# Altium footprint library LibPCB.PcbLib: 76 footprints (part 3 of 5)
Each footprint in its own frame and in the unit in brackets; x right, y up, seen from the top. Pads: shape width x height; smd on the part's side, far side on the other; paste and mask are expansions set on the pad; w line width, h text height; cw(c..) or ccw(c..) is an arc to the next point about the centre after c.
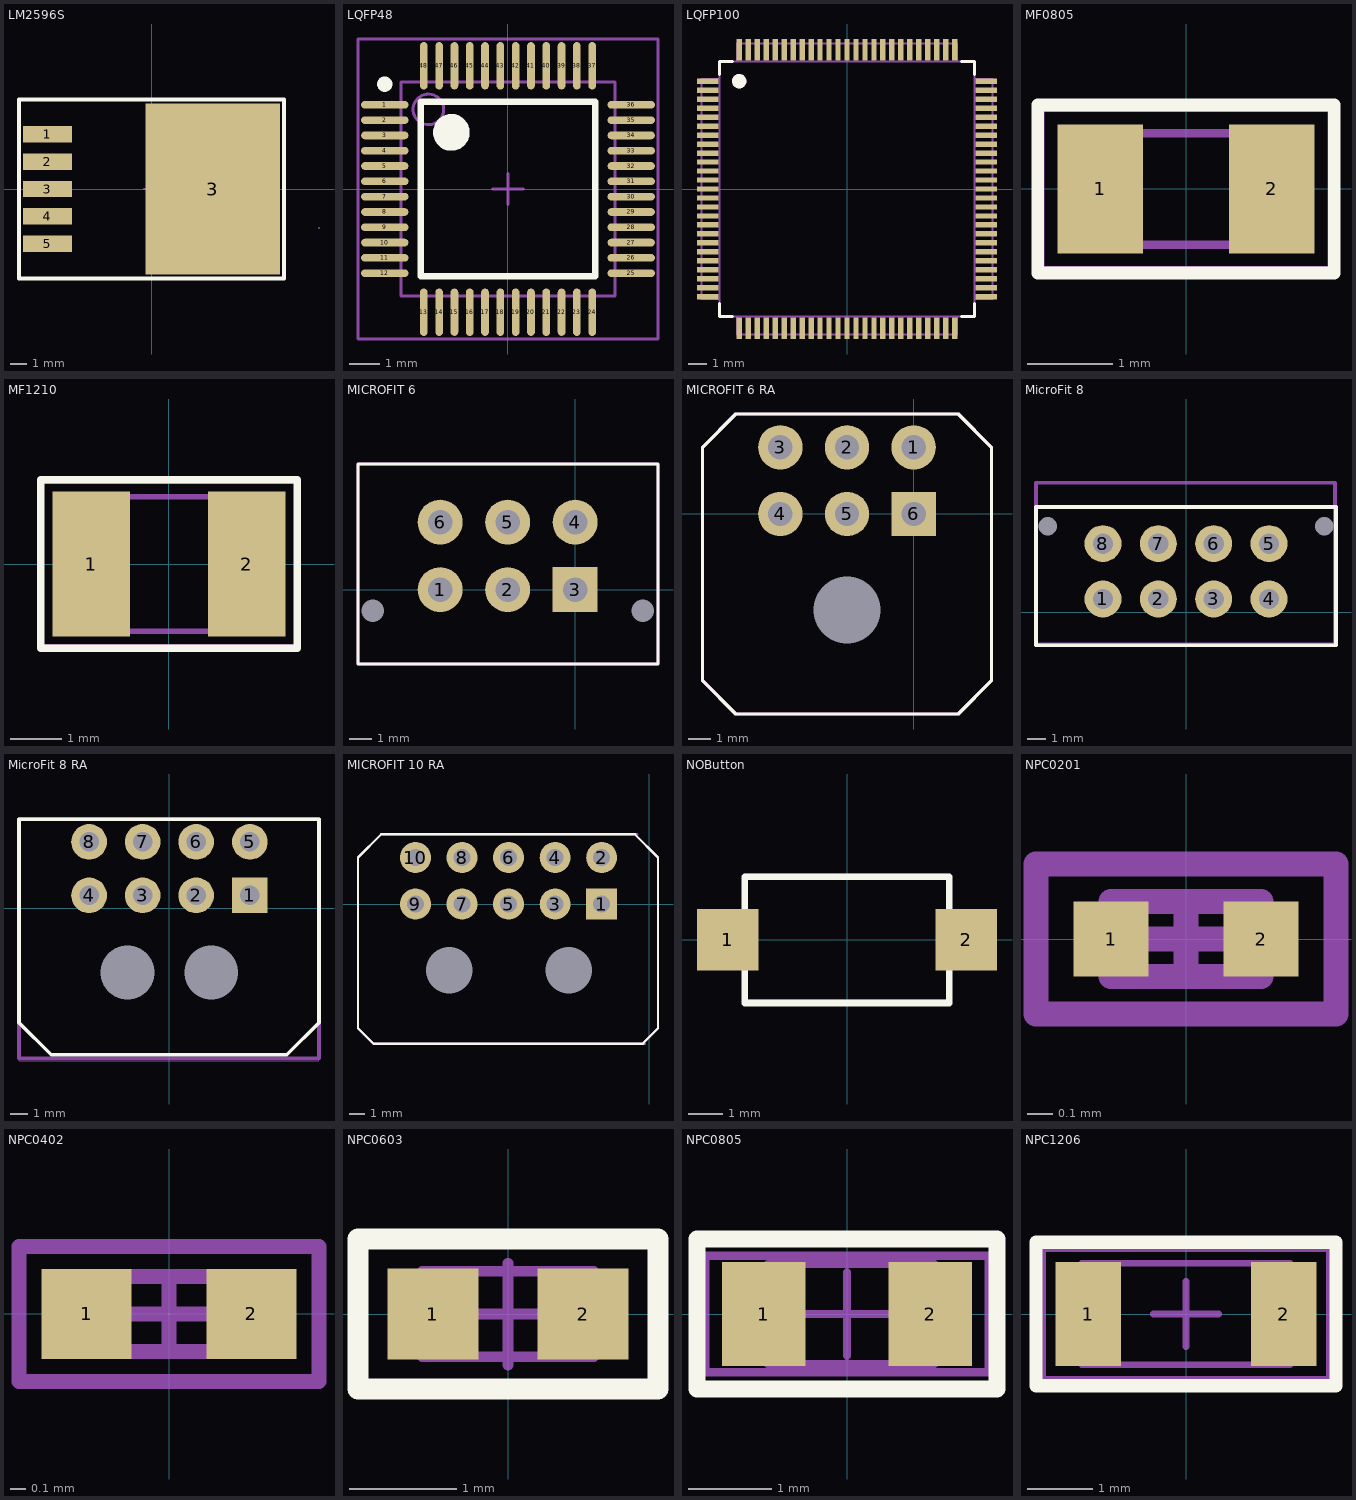
[diagram p2: the footprints below, top view; thin cyan lines are the x and y axes]

## LM2596S [mm]
pads (6):
  rect 3.05x1.016 smd: 1(-6.485,3.404) 2(-6.485,1.702) 3(-6.485,0) 4(-6.485,-1.702) 5(-6.485,-3.404)
  rect 8.38x10.66 smd: 3(3.82,0)
Top Overlay:
  lines w0.25: -8.26,-5.58 8.26,-5.58 8.26,5.58 -8.26,5.58 -8.26,-5.58
Mechanical 1:
  lines w0.1: -8.26,-5.58 8.26,-5.58 ; -8.26,5.58 8.26,5.58 ; 8.26,-5.58 8.26,5.58 ; 8.26,-5.58 8.26,5.58 ; 10.426,-2.428 10.426,-2.428
Mechanical 15:
  lines w0.1: -0.5,0 0.5,0 ; 0,-0.5 0,0.5 ; -8.26,-5.58 8.26,-5.58 8.26,5.58 -8.26,5.58 -8.26,-5.58
3D body "TS5B.stp": height 4.8, standoff -0.05, extent -7.048,-5.207 5.083,5.207

## LQFP48 [mm]
height 1.6
pads (48):
  oval 1.55x0.25 smd: 1(-4.025,2.75) 2(-4.025,2.25) 3(-4.025,1.75) 4(-4.025,1.25) 5(-4.025,0.75) 6(-4.025,0.25) 7(-4.025,-0.25) 8(-4.025,-0.75) 9(-4.025,-1.25) 10(-4.025,-1.75) 11(-4.025,-2.25) 12(-4.025,-2.75) 25(4.025,-2.75) 26(4.025,-2.25) 27(4.025,-1.75) 28(4.025,-1.25) 29(4.025,-0.75) 30(4.025,-0.25) 31(4.025,0.25) 32(4.025,0.75) 33(4.025,1.25) 34(4.025,1.75) 35(4.025,2.25) 36(4.025,2.75)
  oval 0.25x1.55 smd: 13(-2.75,-4.025) 14(-2.25,-4.025) 15(-1.75,-4.025) 16(-1.25,-4.025) 17(-0.75,-4.025) 18(-0.25,-4.025) 19(0.25,-4.025) 20(0.75,-4.025) 21(1.25,-4.025) 22(1.75,-4.025) 23(2.25,-4.025) 24(2.75,-4.025) 37(2.75,4.025) 38(2.25,4.025) 39(1.75,4.025) 40(1.25,4.025) 41(0.75,4.025) 42(0.25,4.025) 43(-0.25,4.025) 44(-0.75,4.025) 45(-1.25,4.025) 46(-1.75,4.025) 47(-2.25,4.025) 48(-2.75,4.025)
Top Overlay:
  circle w0.6: c-1.85,1.85 r0.3
  circle w0.25: c-4.025,3.425 r0.125
  lines w0.2: -2.85,-2.85 2.85,-2.85 2.85,2.85 -2.85,2.85 -2.85,-2.85
Mechanical 13:
  circle w0.1: c-2.6,2.6 r0.5
  lines w0.1: -3.5,-3.5 3.5,-3.5 3.5,3.5 -3.5,3.5 -3.5,-3.5
Mechanical 15:
  lines w0.1: -0.5,0 0.5,0 ; 0,-0.5 0,0.5 ; -4.9,-4.9 4.9,-4.9 4.9,4.9 -4.9,4.9 -4.9,-4.9
3D body: height 1.6, standoff 0, extent -3.5,-3.5 3.5,3.5

## LQFP100 [mm] "Microcontroller"
height 1.6
pads (100):
  rect 1.2x0.3 smd: 1(-7.75,6) 2(-7.75,5.5) 3(-7.75,5) 4(-7.75,4.5) 5(-7.75,4) 6(-7.75,3.5) 7(-7.75,3) 8(-7.75,2.5) 9(-7.75,2) 10(-7.75,1.5) 11(-7.75,1) 12(-7.75,0.5) 13(-7.75,0) 14(-7.75,-0.5) 15(-7.75,-1) 16(-7.75,-1.5) 17(-7.75,-2) 18(-7.75,-2.5) 19(-7.75,-3) 20(-7.75,-3.5) 21(-7.75,-4) 22(-7.75,-4.5) 23(-7.75,-5) 24(-7.75,-5.5) 25(-7.75,-6) 51(7.75,-6) 52(7.75,-5.5) 53(7.75,-5) 54(7.75,-4.5) 55(7.75,-4) 56(7.75,-3.5) 57(7.75,-3) 58(7.75,-2.5) 59(7.75,-2) 60(7.75,-1.5) 61(7.75,-1) 62(7.75,-0.5) 63(7.75,0) 64(7.75,0.5) 65(7.75,1) 66(7.75,1.5) 67(7.75,2) 68(7.75,2.5) 69(7.75,3) 70(7.75,3.5) 71(7.75,4) 72(7.75,4.5) 73(7.75,5) 74(7.75,5.5) 75(7.75,6)
  rect 0.3x1.2 smd: 26(-6,-7.75) 27(-5.5,-7.75) 28(-5,-7.75) 29(-4.5,-7.75) 30(-4,-7.75) 31(-3.5,-7.75) 32(-3,-7.75) 33(-2.5,-7.75) 34(-2,-7.75) 35(-1.5,-7.75) 36(-1,-7.75) 37(-0.5,-7.75) 38(0,-7.75) 39(0.5,-7.75) 40(1,-7.75) 41(1.5,-7.75) 42(2,-7.75) 43(2.5,-7.75) 44(3,-7.75) 45(3.5,-7.75) 46(4,-7.75) 47(4.5,-7.75) 48(5,-7.75) 49(5.5,-7.75) 50(6,-7.75) 76(6,7.75) 77(5.5,7.75) 78(5,7.75) 79(4.5,7.75) 80(4,7.75) 81(3.5,7.75) 82(3,7.75) 83(2.5,7.75) 84(2,7.75) 85(1.5,7.75) 86(1,7.75) 87(0.5,7.75) 88(0,7.75) 89(-0.5,7.75) 90(-1,7.75) 91(-1.5,7.75) 92(-2,7.75) 93(-2.5,7.75) 94(-3,7.75) 95(-3.5,7.75) 96(-4,7.75) 97(-4.5,7.75) 98(-5,7.75) 99(-5.5,7.75) 100(-6,7.75)
Top Overlay:
  circle w0.4: c-6,6 r0.2
  lines w0.15: -7.1,-6.375 -7.1,-7.1 -6.375,-7.1 ; -7.1,6.375 -7.1,7.1 -6.375,7.1 ; 6.375,-7.1 7.1,-7.1 7.1,-6.375 ; 6.375,7.1 7.1,7.1 7.1,6.375
Mechanical 9:
  text ".Comment" at -1.08,-0.495 h0.6
  text ".Designator" at -1.2,0.155 h0.8
Mechanical 11:
  circle w0.4: c-6,6 r0.2
  lines w0.1: -7.1,-6.135 -8.1,-6.135 -8.1,6.135 -7.1,6.135 ; -6.135,-7.1 -6.135,-8.1 6.135,-8.1 6.135,-7.1 ; -6.135,7.1 -6.135,8.1 6.135,8.1 6.135,7.1 ; 7.1,-6.135 8.1,-6.135 8.1,6.135 7.1,6.135 ; -7.1,-7.1 7.1,-7.1 7.1,7.1 -7.1,7.1 -7.1,-7.1
3D body "User Library-LQFP100_Grid_0_5.STEP": height 1.6, standoff 0, extent -8.025,-8 7.975,8

## MF0805 [mm]
height 0.5
pads (2):
  rect 1x1.5 smd: 1(-1,0) 2(1,0)
Top Overlay:
  lines w0.15: -1.73,-0.98 1.73,-0.98 1.73,0.98 -1.73,0.98 -1.73,-0.98
Mechanical 9:
  text ".Comment" at -0.9,1.2 h0.6
  text ".Designator" at -1.3,1.9 h0.8
Mechanical 11:
  lines w0.1: -1.7,-0.95 -1.7,0.95 1.7,0.95 1.7,-0.95 -1.7,-0.95
Mechanical 15:
  lines w0.1: -1.05,-0.65 1.05,-0.65 1.05,0.65 -1.05,0.65 -1.05,-0.65
3D body "mf-psmf050x-2.stp": height 0.66, standoff 0, extent -1.075,-0.675 1.075,0.675

## MF1210 [mm]
height 0.55
pads (2):
  rect 1.5x2.8 smd: 1(-1.5,0) 2(1.5,0)
Top Overlay:
  lines w0.15: -2.48,-1.63 -2.48,1.63 2.48,1.63 2.48,-1.63 -2.48,-1.63
Mechanical 9:
  text ".Comment" at -0.9,1.9 h0.6
  text ".Designator" at -1.3,2.6 h0.8
Mechanical 11:
  lines w0.1: -1.55,-1.3 1.55,-1.3 1.55,1.3 -1.55,1.3 -1.55,-1.3
Mechanical 15:
  lines w0.1: -2.5,-1.6 -2.5,1.6 2.5,1.6 2.5,-1.6 -2.5,-1.6
3D body "User Library-0_2A--MF-USMF020.step": height 1.1, standoff 0, extent -1.715,-1.4 1.715,1.4

## MICROFIT 6 [mm]
pads (8):
  round 2 hole 1.1: 1(-6,0) 2(-3,0) 4(0,3) 5(-3,3) 6(-6,3)
  rect 2x2 hole 1.1: 3(0,0)
  round 0 hole 1 unplated: ""(-9,-0.94) ""(3,-0.94)
Top Overlay:
  lines w0.15: -9.652,-3.302 3.683,-3.302 3.683,5.588 -9.652,5.588 -9.652,-3.302
Mechanical 9:
  text ".Comment" at -1.627,-2.764 h0.6
  text ".Designator" at -1.637,-2.194 h0.8
Mechanical 11:
  lines w0.15: -9.652,-3.302 -9.652,5.588 3.683,5.588 3.683,-3.302 -9.652,-3.302
3D body "430450612.stp": height 9.95, standoff -3.14, extent -9.575,-3.3 3.575,5.47

## MICROFIT 6 RA [mm]
pads (7):
  round 2 hole 1.1: 1(0,3) 2(-3,3) 3(-6,3) 4(-6,0) 5(-3,0)
  rect 2x2 hole 1.1: 6(0,0)
  round 1.5 hole 3 unplated: ""(-3,-4.32)
Top Overlay:
  lines w0.15: -9.5,-7.5 -8,-9 2,-9 3.5,-7.5 3.5,3 2,4.5 -8,4.5 -9.5,3 -9.5,-7.5
Mechanical 9:
  text ".Designator" at -2.78,-7.02 h0.8
  text ".Comment" at -2.77,-7.59 h0.6
Mechanical 11:
  lines w0.15: -9.5,-7.5 -8,-9 2,-9 3.5,-7.5 3.5,3 2,4.5 -8,4.5 -9.5,3 -9.5,-7.5
3D body "430450601.stp": height 8.73, standoff -3.21, extent -9.575,-8.95 3.575,3.29

## MicroFit 8 [mm]
pads (10):
  round 2 hole 1.1: 1(-4.5,0.73) 2(-1.5,0.73) 3(1.5,0.73) 4(4.5,0.73) 5(4.5,3.73) 6(1.5,3.73) 7(-1.5,3.73) 8(-4.5,3.73)
  round 0 hole 1 mask+0: ""(-7.5,4.67) ""(7.5,4.67)
Top Overlay:
  lines w0.2: -8.128,-1.778 3.753,-1.778 8.128,-1.778 8.128,5.715 -8.128,5.715 -8.128,-1.778
Mechanical 9:
  text ".Designator" at -1.85,-1.325 h0.8
  text ".Comment" at -1.45,-2.025 h0.6
Mechanical 11:
  lines w0.2: -8.128,-1.74 8.075,-1.74 8.075,7.03 -8.128,7.03 -8.128,-1.74
Mechanical 15:
  lines w0.05: -8.128,-1.74 8.075,-1.74 8.075,7.03 -8.128,7.03 -8.128,-1.74
3D body: height 0.25, standoff 0, extent 5.08,-1.016 5.08,-1.016
3D body "430450827.stp": height 9.95, standoff -3.14, extent -8.075,-1.74 8.075,7.03

## MicroFit 8 RA [mm]
pads (10):
  rect 2x2 hole 1.1: 1(4.5,0.73)
  round 2 hole 1.1: 2(1.5,0.73) 3(-1.5,0.73) 4(-4.5,0.73) 5(4.5,3.73) 6(1.5,3.73) 7(-1.5,3.73) 8(-4.5,3.73)
  round 1 hole 3: ""(-2.35,-3.59) ""(2.35,-3.59)
Top Overlay:
  lines w0.2: -8.425,-6.4 -6.625,-8.2 6.575,-8.2 8.375,-6.4 8.375,-6.175 8.375,5 -8.425,5 -8.425,-6.175 -8.425,-6.4
Mechanical 9:
  text ".Designator" at -1.85,-1.325 h0.8
  text ".Comment" at -1.45,-2.025 h0.6
Mechanical 11:
  lines w0.2: -8.425,-8.4 8.375,-8.4 8.375,5 -8.425,5 -8.425,-8.4
Mechanical 15:
  lines w0.05: -8.4,-8.525 8.35,-8.525 8.35,5.1 -8.4,5.1 -8.4,-8.525
3D body "microfit 8.stp": height 8.8, standoff 0.03, extent -8.075,-8.25 8.075,4.84

## MICROFIT 10 RA [mm]
pads (12):
  rect 2x2 hole 1.1: 1(-3.048,0)
  round 2 hole 1.1: 2(-3.048,3) 3(-6.048,0) 4(-6.048,3) 5(-9.048,0) 6(-9.048,3) 7(-12.048,0) 8(-12.048,3) 9(-15.048,0) 10(-15.048,3)
  round 1.5 hole 3 unplated: ""(-12.875,-4.25) ""(-5.175,-4.25)
Top Overlay:
  lines w0.15: -0.921,4.5 0.579,3 0.579,-8 -0.421,-9 ; -0.889,4.5 -17.25,4.5 -18.75,3 -18.75,-8 -17.75,-9 -0.381,-9
  lines w0.254: -15.048,0 -15,0
Mechanical 9:
  text ".Comment" at -2.745,-7.59 h0.6
  text ".Designator" at -2.755,-7.02 h0.8
Mechanical 11:
  lines w0.15: -0.921,4.5 0.579,3 0.579,-8 -0.421,-9 ; -0.762,4.5 -17.25,4.5 -18.75,3 -18.75,-8 -17.75,-9 -0.254,-9
3D body "430451000.stp": height 8.83, standoff -3.12, extent -18.6,-8.92 0.55,3.32

## NOButton [mm]
height 2.5
pads (2):
  rect 1.8x1.8 smd: 1(-3.5,0) 2(3.5,0)
Top Overlay:
  lines w0.2: -3,-1.85 -3,1.5 -3,1.85 3,1.85 3,-1.5 3,-1.85 -3,-1.85
Mechanical 9:
  text ".Designator" at -1.703,3.273 h0.8
  text ".Comment" at -1.303,2.573 h0.6
Mechanical 11:
  lines w0.1: -3,-1.5 -3,-1.8 3,-1.8 3,-1.5 ; -3,1.5 -3,1.9 3,1.9 3,1.5
3D body "Кнопка_IT-1181.STEP": height 2.5, standoff 0, extent -4,-1.8 4,1.8

## NPC0201 [mm] "Non polar chip capacitor, size 0201"
height 0.23
pads (2):
  rect 0.3x0.3 smd: 1(-0.3,0) 2(0.3,0)
Mechanical 1:
  lines w0.1: -0.3,-0.15 0.3,-0.15 0.3,0.15 -0.3,0.15 -0.3,-0.15
Mechanical 9:
  text ".Comment" at -1.054,-0.524 h0.6
  text ".Designator" at -1.454,0.176 h0.8
Mechanical 11:
  lines w0.1: -0.6,-0.3 -0.6,0.3 0.6,0.3 0.6,-0.3 -0.6,-0.3
Mechanical 15:
  lines w0.1: -0.15,0 0.15,0 ; 0,-0.15 0,0.15
3D body "User Library-0201(0603M) Cap.STEP": height 0.31, standoff 0, extent -0.305,-0.152 0.305,0.152

## NPC0402 [mm] "Non polar chip capacitor, size 0402"
height 0.35
pads (2):
  rect 0.6x0.6 smd: 1(-0.55,0) 2(0.55,0)
Mechanical 1:
  lines w0.1: -0.5,-0.25 0.5,-0.25 0.5,0.25 -0.5,0.25 -0.5,-0.25
Mechanical 9:
  text ".Comment" at -1.054,-0.524 h0.6
  text ".Designator" at -1.454,0.176 h0.8
Mechanical 11:
  lines w0.1: -1,-0.45 -1,0.45 1,0.45 1,-0.45 -1,-0.45
Mechanical 15:
  lines w0.1: -0.25,0 0.25,0 ; 0,-0.25 0,0.25
3D body "User Library-0402(1005M) Cap.step": height 0.51, standoff 0, extent -0.508,-0.254 0.508,0.254

## NPC0603 [mm] "Non polar chip capacitor, size 0603"
height 0.45
pads (2):
  rect 0.85x0.85 smd: 1(-0.7,0) 2(0.7,0)
Top Overlay:
  lines w0.2: -1.4,-0.7 1.4,-0.7 1.4,0.7 -1.4,0.7 -1.4,-0.7
Mechanical 1:
  lines w0.1: -0.8,-0.4 0.8,-0.4 0.8,0.4 -0.8,0.4 -0.8,-0.4
Mechanical 9:
  text ".Designator" at -1.454,0.049 h0.8
  text ".Comment" at -1.054,-0.651 h0.6
Mechanical 11:
  lines w0.1: -1.4,-0.7 1.4,-0.7 1.4,0.7 -1.4,0.7 -1.4,-0.7
Mechanical 15:
  lines w0.1: -0.475,0 0.475,0 ; 0,-0.475 0,0.475
3D body "SW3dPS-0603 SMD Capacitor.STEP": height 0.3, standoff 0, extent -0.8,-0.4 0.8,0.4

## NPC0805 [mm] "Non polar chip capacitor, size 0805"
height 0.45
pads (2):
  rect 1x1.25 smd: 1(-1,0) 2(1,0)
Top Overlay:
  lines w0.2: -1.8,-0.9 1.8,-0.9 1.8,0.9 -1.8,0.9 -1.8,-0.9
Mechanical 1:
  lines w0.1: -0.949,-0.6 1.05,-0.6 1.05,0.6 -0.949,0.6 -0.949,-0.6
Mechanical 9:
  text ".Comment" at -0.508,-0.508 h0.6
  text ".Designator" at -1.397,0.127 h0.8
Mechanical 11:
  lines w0.1: -1.7,-0.7 1.7,-0.7 1.7,0.7 -1.7,0.7 -1.7,-0.7
Mechanical 15:
  lines w0.1: -0.5,0 0.5,0 ; 0,-0.5 0,0.5
3D body "SW3dPS-0805 SMD Capacitor.STEP": height 0.78, standoff 0, extent -1,-0.625 1,0.625

## NPC1206 [mm] "Non polar chip capacitor, size 1206"
height 0.6
pads (2):
  rect 1x1.6 smd: 1(-1.5,0) 2(1.5,0)
Top Overlay:
  lines w0.2: -2.3,-1.1 -2.3,1.1 2.3,1.1 2.3,-1.1 -2.3,-1.1
Mechanical 1:
  lines w0.1: -1.6,-0.775 -1.6,0.775 1.6,0.775 1.6,-0.775 -1.6,-0.775
Mechanical 9:
  text ".Designator" at -1.454,0.176 h0.8
  text ".Comment" at -1.054,-0.524 h0.6
Mechanical 11:
  lines w0.1: -2.2,-1 2.2,-1 2.2,1 -2.2,1 -2.2,-1
Mechanical 15:
  lines w0.1: -0.5,0 0.5,0 ; 0,-0.5 0,0.5
3D body "SW3dPS-1206 SMD Capacitor.STEP": height 1, standoff 0, extent -1.6,-0.8 1.6,0.8